# Altium footprint library MyPcbLib.PcbLib: 278 footprints (part 8 of 18)
Each footprint in its own frame and in the unit in brackets; x right, y up, seen from the top. Pads: shape width x height; smd on the part's side, far side on the other; paste and mask are expansions set on the pad; w line width, h text height; cw(c..) or ccw(c..) is an arc to the next point about the centre after c.
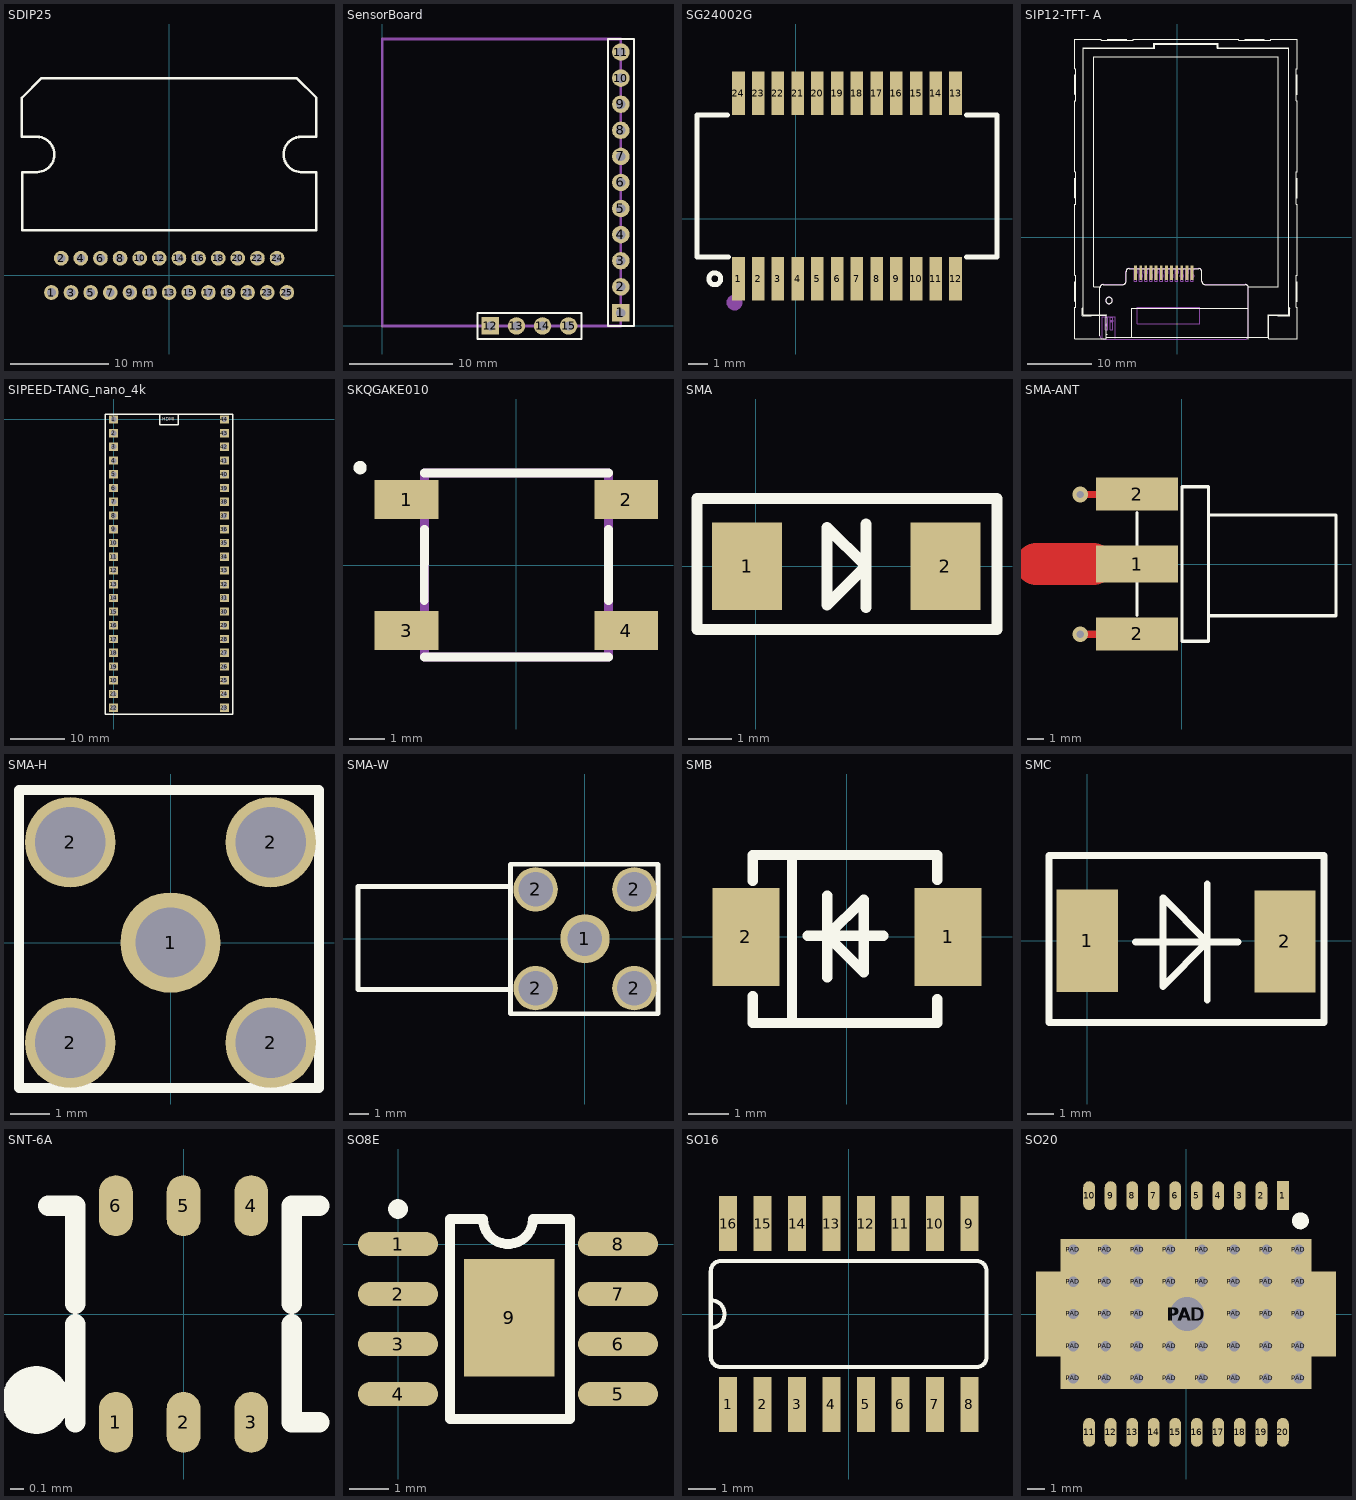
[diagram p7: the footprints below, top view; thin cyan lines are the x and y axes]

## SDIP25 [mm]
pads (25):
  round 1.5 hole 0.9: 1(-12,-1.75) 2(-11,1.75) 3(-10,-1.75) 4(-9,1.75) 5(-8,-1.75) 6(-7,1.75) 7(-6,-1.75) 8(-5,1.75) 9(-4,-1.75) 10(-3,1.75) 11(-2,-1.75) 12(-1,1.75) 13(0,-1.75) 14(1,1.75) 15(2,-1.75) 16(3,1.75) 17(4,-1.75) 18(5,1.75) 19(6,-1.75) 20(7,1.75) 21(8,-1.75) 22(9,1.75) 23(10,-1.75) 24(11,1.75) 25(12,-1.75)
Top Overlay:
  lines w0.254: -14.986,10.505 -14.986,4.6 15,4.6 15,10.53 ; -14.986,10.53 -13.437,10.53 ; -13.538,14.137 -15,14.137 -15,18.1 -13,20.1 13,20.1 15,18.1 15,14.137 ; 13.386,14.137 14.975,14.137 ; 13.437,10.53 14.975,10.53
  lines w0.257: -13.459,14.12 cw(c-13.5,12.321) -13.451,10.521 ; 13.426,14.12 ccw(c13.475,12.321) 13.433,10.521
3D body "HZIP25.step": height 19.2, standoff -2.5, extent -14.063,-1.882 15.138,6.528

## SensorBoard [mm] "舱温水深传感器解算板"
pads (15):
  rect 1.7x1.7 hole 0.9: 1(23.241,1.27) 12(10.541,0)
  round 1.7 hole 0.9: 2(23.241,3.81) 3(23.241,6.35) 4(23.241,8.89) 5(23.241,11.43) 6(23.241,13.97) 7(23.241,16.51) 8(23.241,19.05) 9(23.241,21.59) 10(23.241,24.13) 11(23.241,26.67) 13(13.081,0) 14(15.621,0) 15(18.161,0)
Top Overlay:
  lines w0.2: 9.271,-1.27 9.271,1.27 19.431,1.27 19.431,-1.27 9.271,-1.27 ; 21.971,0 24.511,0 24.511,27.94 21.971,27.94 21.971,0
Mechanical 1:
  lines w0.254: 0,0 23.241,0 23.241,8.382 23.241,27.94 0,27.94 0,8.382 0,0
3D body "HDR2.54-1P.STEP": height 8.5, standoff -3, extent 21.971,25.4 24.511,27.94
3D body "HDR2.54-1P.STEP": height 8.5, standoff -3, extent 21.971,22.86 24.511,25.4
3D body "HDR2.54-1P.STEP": height 8.5, standoff -3, extent 21.971,17.78 24.511,20.32
3D body "HDR2.54-1P.STEP": height 8.5, standoff -3, extent 21.971,20.32 24.511,22.86
3D body "HDR2.54-1P.STEP": height 8.5, standoff -3, extent 21.971,12.7 24.511,15.24
3D body "HDR2.54-1P.STEP": height 8.5, standoff -3, extent 21.971,15.24 24.511,17.78
3D body "HDR2.54-1P.STEP": height 8.5, standoff -3, extent 21.971,10.16 24.511,12.7
3D body "HDR2.54-1P.STEP": height 8.5, standoff -3, extent 21.971,5.08 24.511,7.62
3D body "HDR2.54-1P.STEP": height 8.5, standoff -3, extent 21.971,7.62 24.511,10.16
3D body "HDR2.54-1P.STEP": height 8.5, standoff -3, extent 21.971,0 24.511,2.54
3D body "HDR2.54-1P.STEP": height 8.5, standoff -3, extent 21.971,2.54 24.511,5.08
3D body "HDR2.54-1P.STEP": height 8.5, standoff -3, extent 9.271,-1.27 11.811,1.27
3D body "HDR2.54-1P.STEP": height 8.5, standoff -3, extent 11.811,-1.27 14.351,1.27
3D body "HDR2.54-1P.STEP": height 8.5, standoff -3, extent 14.351,-1.27 16.891,1.27
3D body "HDR2.54-1P.STEP": height 8.5, standoff -3, extent 16.891,-1.27 19.431,1.27

## SG24002G [mm]
pads (24):
  rect 0.64x2.2 smd: 1(-2.899,-3.043) 2(-1.899,-3.043) 3(-0.899,-3.043) 4(0.101,-3.043) 5(1.101,-3.043) 6(2.101,-3.043) 7(3.101,-3.043) 8(4.101,-3.043) 9(5.101,-3.043) 10(6.101,-3.043) 11(7.101,-3.043) 12(8.101,-3.043) 13(8.101,6.357) 14(7.101,6.357) 15(6.101,6.357) 16(5.101,6.357) 17(4.101,6.357) 18(3.101,6.357) 19(2.101,6.357) 20(1.101,6.357) 21(0.101,6.357) 22(-0.899,6.357) 23(-1.899,6.357) 24(-2.899,6.357)
Top Overlay:
  circle w0.254: c-4.099,-3.043 r0.3
  lines w0.254: -3.45,5.257 -4.999,5.257 -4.999,-1.943 -3.399,-1.943 ; 8.652,-1.943 10.201,-1.943 10.201,5.257 8.652,5.257
Mechanical 15:
  circle w0.4: c-3.099,-4.243 r0.2

## SIP12-TFT- A [mm]
pads (12):
  rect 0.43x2.3 smd: 1(2.305,-5.523) 2(1.505,-5.523) 3(0.705,-5.523) 4(-0.095,-5.523) 5(-0.895,-5.523) 6(-1.695,-5.523) 7(-2.495,-5.523) 8(-3.295,-5.523) 9(-4.095,-5.523) 10(-4.895,-5.523) 11(-5.695,-5.523) 12(-6.495,-5.523)
Top Overlay:
  circle w0.127: c-10.635,-9.83 r0.5
  lines w0.127: -15.793,-9.916 -15.993,-9.916 ; -15.793,-6.916 -15.993,-6.916 ; -15.793,6.184 -15.993,6.184 ; -15.793,9.184 -15.993,9.184 ; -15.793,22.284 -15.993,22.284 ; -15.793,25.284 -15.993,25.284 ; -14.243,-12.202 -14.243,-12.052 ; -12.036,-15.354 -12.036,-7.854 cw(c-11.536,-7.854) -11.536,-7.354 -8.476,-7.354 ccw(c-8.476,-6.854) -7.976,-6.854 -7.976,-5.354 cw(c-7.476,-5.354) -7.476,-4.854 3.324,-4.854 cw(c3.324,-5.354) 3.824,-5.354 3.824,-6.854 ccw(c4.324,-6.854) 4.324,-7.354 10.574,-7.354 cw(c10.574,-7.854) 11.074,-7.854 11.074,-15.516 ; -12.036,-7.696 -13.009,-7.696 -13.009,28.144 15.723,28.144 15.723,-7.696 11.074,-7.696 ; -11.043,-15.566 14.257,-15.566 ; -10.943,-15.516 14.157,-15.516 14.157,-12.052 17.323,-12.052 17.323,29.468 6.257,29.468 6.257,30.084 -3.543,30.084 -3.543,29.468 -14.609,29.468 -14.609,-12.052 -10.943,-12.052 ; -10.943,-15.066 -11.043,-15.066 -10.893,-15.066 ; -10.84,30.684 -10.84,30.884 ; -8.643,-15.566 -8.643,-15.516 ; -7.84,30.684 -7.84,30.884 ; -7.083,-15.494 -7.083,-11.002 11.057,-11.002 11.057,-15.824 ; 10.555,30.684 10.555,30.884 ; 11.857,-15.566 11.857,-15.516 ; 13.555,30.684 13.555,30.884 ; 14.107,-15.066 14.257,-15.066 14.157,-15.066 ; 17.157,-12.202 17.157,-12.052 ; 17.373,-4.466 17.373,22.214 ; 18.507,-9.916 18.707,-9.916 ; 18.507,-6.916 18.707,-6.916 ; 18.507,6.184 18.707,6.184 ; 18.507,9.184 18.707,9.184 ; 18.507,22.284 18.707,22.284 ; 18.507,25.284 18.707,25.284 ; -15.993,-9.916 -15.993,-6.916 ; -15.993,-9.916 -15.993,-6.916 ; -15.993,6.184 -15.993,9.184 ; -15.993,6.184 -15.993,9.184 ; -15.993,22.284 -15.993,25.284 ; -15.993,22.284 -15.993,25.284 ; -10.84,30.884 -7.84,30.884 ; -10.84,30.884 -7.84,30.884 ; 10.555,30.884 13.555,30.884 ; 10.555,30.884 13.555,30.884 ; 18.707,-9.916 18.707,-6.916 ; 18.707,-9.916 18.707,-6.916 ; 18.707,6.184 18.707,9.184 ; 18.707,6.184 18.707,9.184 ; 18.707,22.284 18.707,25.284 ; 18.707,22.284 18.707,25.284 ; -15.993,-15.816 -11.043,-15.816 -11.043,-12.102 -13.259,-12.102 -13.366,-12.202 -14.759,-12.202 -14.759,-11.062 -14.659,-10.898 -14.659,29.518 -3.643,29.518 -3.643,30.184 6.357,30.184 6.357,29.518 17.373,29.518 17.373,-10.898 17.473,-11.062 17.473,-12.202 15.657,-12.202 15.527,-12.102 14.257,-12.102 14.257,-15.816 18.707,-15.816 18.707,-10.916 18.507,-10.916 18.507,-5.916 18.707,-5.916 18.707,5.184 18.507,5.184 18.507,10.184 18.707,10.184 18.707,21.284 18.507,21.284 18.507,26.284 18.707,26.284 18.707,30.884 14.555,30.884 14.555,30.684 9.555,30.684 9.555,30.884 -6.84,30.884 -6.84,30.684 -11.84,30.684 -11.84,30.884 -15.993,30.884 -15.993,26.284 -15.793,26.284 -15.793,21.284 -15.993,21.284 -15.993,10.184 -15.793,10.184 -15.793,5.184 -15.993,5.184 -15.993,-5.916 -15.793,-5.916 -15.793,-10.916 -15.993,-10.916 -15.993,-15.816
Mechanical 3:
  drawing of 186 lines, arcs and shapes, not listed
  text "K" at -11.202,-14.855 h0.41
  text "A" at -10.395,-14.839 h0.41
3D body "LCD.STEP": height 2.2, standoff 0, extent -15.9,-15.68 18.6,30.92

## SIPEED-TANG_nano_4k [mil]
pads (44):
  rect 65x60 hole 40: 1(0,0) 2(0,-100) 3(0,-200) 4(0,-300) 5(0,-400) 6(0,-500) 7(0,-600) 8(0,-700) 9(0,-800) 10(0,-1900) 10(0,-900) 11(0,-1000) 12(0,-1100) 13(0,-1200) 14(0,-1300) 15(0,-1400) 16(0,-1500) 17(0,-1600) 18(0,-1700) 19(0,-1800) 21(0,-2000) 22(0,-2100) 23(807.09,-2100) 24(807.09,-2000) 25(807.09,-1900) 26(807.09,-1800) 27(807.09,-1700) 28(807.09,-1600) 29(807.09,-1500) 30(807.09,-1400) 31(807.09,-1300) 32(807.09,-1200) 33(807.09,-1100) 34(807.09,-1000) 35(807.09,-900) 36(807.09,-800) 37(807.09,-700) 38(807.09,-600) 39(807.09,-500) 40(807.09,-400) 41(807.09,-300) 42(807.09,-200) 43(807.09,-100) 44(807.09,0)
Top Overlay:
  lines w10: 334.65,39.37 334.65,-39.37 472.44,-39.37 472.44,39.37 ; -59.06,-2145.67 -59.06,39.37 866.14,39.37 866.14,-2145.67 0,-2145.67 -39.37,-2145.67 -59.06,-2145.67
  text "HDMI" at 354.33,-19.68 h39.37

## SKQGAKE010 [mm]
height 1.3
pads (4):
  rect 1.8x1.1 smd: 1(-3.1,1.85) 2(3.1,1.85) 3(-3.1,-1.85) 4(3.1,-1.85)
Top Overlay:
  circle w0.254: c-4.411,2.749 r0.06
  lines w0.254: -2.6,-2.6 2.6,-2.6 ; -2.6,-1 -2.6,1 ; -2.6,2.6 2.6,2.6 ; 2.6,-1 2.6,1
Mechanical 13:
  lines w0.254: -2.6,-2.6 2.6,-2.6 2.6,2.6 -2.6,2.6 -2.6,-2.6
3D body "SKQGAB_ALPS.stp": height 1.5, standoff 0, extent -3.2,-2.6 3.2,2.6

## SMA [mil] "DO-214AC(2010)"
pads (2):
  rect 63x78.74 smd: 1(-8,0) 2(170.56,0)
Top Overlay:
  lines w10: 99,-37 99,38 ; -53,-57 -53,61 217,61 217,-57 -53,-57 ; 64,-35 64,35 99,0 64,-35
3D body "DO-214AC.STEP": height 94.49, standoff 0, extent -7.55,-52.15 173.55,54.15

## SMA-ANT [mil] "142-0701-801/806"
pads (3):
  rect 200x90 smd: 1(-109,0)
  rect 200x80 all layers, no hole: 2(-109,-170) 2(-109,170)
via -247,-171 diameter 38 hole 18
via -247,169 diameter 38 hole 18
Top Layer:
  lines w18: -248,169 -128,169 ; -247,-171 -99,-171
  lines w103: -355,0 -216,0
Top Overlay:
  lines w7.87: -109,-125 -109,125 ; 68,-126 375,-126 375,119 68,119 ; 0,-188 0,188 65,188 65,-188 0,-188
3D body "SMA - 50 Ohm Connectors 142-0701-801.step": height 175.51, standoff -136.3, extent -190.91,-186 370.9,188.8

## SMA-H [mil]
pads (5):
  round 100 hole 70: 1(0,0)
  round 90 hole 70: 2(-100,-100) 2(-100,100) 2(100,-100) 2(100,100)
Top Overlay:
  lines w10: -151,-145 148,-145 148,152 -151,152 -151,-145
3D body "SMA-H.stp": height 105.71, standoff -430.31, extent -124.21,-124.2 124.21,124.22

## SMA-W [mil]
pads (5):
  round 100 hole 70: 1(0,0)
  round 90 hole 70: 2(-100,-100) 2(-100,100) 2(100,-100) 2(100,100)
Top Overlay:
  lines w10: -152,-103 -460,-103 -460,106 -151,106 ; -151,-152 -151,151 148,151 148,-152 -151,-152
3D body "Samtec-SMA-J-P-H-RA-TH1.step": height 108.06, standoff -447.24, extent -459.69,-139.8 134.8,135.79

## SMB [mm] "DO-214AA"
pads (2):
  rect 1.65x2.4 smd: 1(2.475,0) 2(-2.475,0)
Top Overlay:
  lines w0.254: -2.311,-1.448 -2.311,-2.108 2.21,-2.108 2.21,-1.524 ; -2.311,1.372 -2.311,2.007 2.21,2.007 2.21,1.397 ; -1.346,-2.032 -1.346,2.007 ; -0.965,0.025 0.889,0.025 ; -0.483,-0.991 -0.483,1.016 ; -0.483,0.025 0.406,-0.864 0.406,0.914 -0.483,0.025
3D body "DI-214AA(SMB).step": height 2.45, standoff 0.03, extent -2.75,-1.975 2.75,1.925

## SMC [mil] "DO-214AB(2114)"
pads (2):
  rect 90x149.84 smd: 1(0,0)
  rect 90x149.63 smd: 2(290,-1)
Top Overlay:
  lines w10: 71,-2 221,-2 ; 176,-87 176,83 ; -56,-120 347,-120 347,125 -56,125 -56,-120 ; 111,-67 111,63 176,-2 111,-67
3D body "DO-214AB.STEP": height 106.3, standoff 0, extent -14.84,-117.09 304.84,127

## SNT-6A [mm]
height 0.5
pads (6):
  oval 0.25x0.45 smd: 1(-0.5,-0.8) 2(0,-0.8) 3(0.5,-0.8) 4(0.5,0.8) 5(0,0.8) 6(-0.5,0.8)
Top Overlay:
  circle w0.25: c-1.09,-0.635 r0.125
  lines w0.152: -1,0.8 -0.8,0.8 -0.8,0.075 ; -0.8,-0.8 -0.8,-0.075 ; 0.8,-0.075 0.8,-0.8 1,-0.8 ; 0.8,0.075 0.8,0.8 1,0.8
3D body "SNT-6A.STEP": height 0.5, standoff 0, extent -0.799,-0.898 0.799,0.9

## SO8E [mil]
pads (9):
  oval 80x24 smd: 1(0,0) 2(0,-50) 3(0,-100) 4(0,-150) 5(220,-150) 6(220,-100) 7(220,-50) 8(220,0)
  rect 90.55x117.72 smd: 9(111.23,-73.8)
Top Overlay:
  circle w9.84: c0,35 r4.92
  lines w10: 52,-175 172,-175 172,25 135,25 cw(c110,25) 85,25 52,25 52,-175
3D body "SOP8.STEP": height 62.99, standoff 0, extent -7.7,-172.62 230.17,25.02

## SO16 [mil]
pads (16):
  rect 26x80 smd: 1(-175,-131) 2(-125,-131) 3(-75,-131) 4(-25,-131) 5(25,-131) 6(75,-131) 7(125,-131) 8(175,-131) 9(175,131) 10(125,131) 11(75,131) 12(25,131) 13(-25,131) 14(-75,131) 15(-125,131) 16(-175,131)
Top Overlay:
  lines w6: -200,-20 ccw(c-200,0) -200,20 ; -200,-20 -200,-62 ccw(c-185,-62) -185,-77 185,-77 ccw(c185,-62) 200,-62 200,62 ccw(c185,62) 185,77 -185,77 ccw(c-185,62) -200,62 -200,20 ; -200,-20 -200,20
3D body "User Library-SOP16_208mil (5_3mm).STEP": height 70.87, standoff -7.87, extent -200.78,-155.93 200.79,155.92

## SO20 [mm]
pads (63):
  rect 0.7x1.7 smd mask+0.07: 1(5.715,6.985)
  oval 0.7x1.7 smd mask+0.07: 2(4.445,6.985) 3(3.175,6.985) 4(1.905,6.985) 5(0.635,6.985) 6(-0.635,6.985) 7(-1.905,6.985) 8(-3.175,6.985) 9(-4.445,6.985) 10(-5.715,6.985) 11(-5.715,-6.985) 12(-4.445,-6.985) 13(-3.175,-6.985) 14(-1.905,-6.985) 15(-0.635,-6.985) 16(0.635,-6.985) 17(1.905,-6.985) 18(3.175,-6.985) 19(4.445,-6.985) 20(5.715,-6.985)
  round 0.9 hole 0.6 mask+0.06: PAD(-6.65,-3.8) PAD(-6.65,-1.9) PAD(-6.65,0) PAD(-6.65,1.9) PAD(-6.65,3.8) PAD(-4.75,-3.8) PAD(-4.75,-1.9) PAD(-4.75,0) PAD(-4.75,1.9) PAD(-4.75,3.8) PAD(-2.85,-3.8) PAD(-2.85,-1.9) PAD(-2.85,0) PAD(-2.85,1.9) PAD(-2.85,3.8) PAD(-0.95,-3.8) PAD(-0.95,-1.9) PAD(-0.95,1.9) PAD(-0.95,3.8) PAD(0.95,-3.8) PAD(0.95,-1.9) PAD(0.95,1.9) PAD(0.95,3.8) PAD(2.85,-3.8) PAD(2.85,-1.9) PAD(2.85,0) PAD(2.85,1.9) PAD(2.85,3.8) PAD(4.75,-3.8) PAD(4.75,-1.9) PAD(4.75,0) PAD(4.75,1.9) PAD(4.75,3.8) PAD(6.65,-3.8) PAD(6.65,-1.9) PAD(6.65,0) PAD(6.65,1.9) PAD(6.65,3.8)
  rect 14.8x8.828 smd mask+0.06: PAD(0,0)
  rect 9.8x6.2 smd mask+0.06: PAD(0,0)
  rect 17.7x3 smd mask+0.06: PAD(0,0)
  rect 17.7x5 smd mask+0.06: PAD(0,0)
  round 2.5 hole 2 mask+0.06: PAD(0.069,0)
Top Overlay:
  circle w0.5: c6.75,5.5 r0.25
3D body "User Library-PowerSO20.STEP": height 3.6, standoff 0, extent -8,-7.2 8,7.2